# Altium footprint library MEBot.PcbLib: 161 footprints (part 5 of 11)
Each footprint in its own frame and in the unit in brackets; x right, y up, seen from the top. Pads: shape width x height; smd on the part's side, far side on the other; paste and mask are expansions set on the pad; w line width, h text height; cw(c..) or ccw(c..) is an arc to the next point about the centre after c.
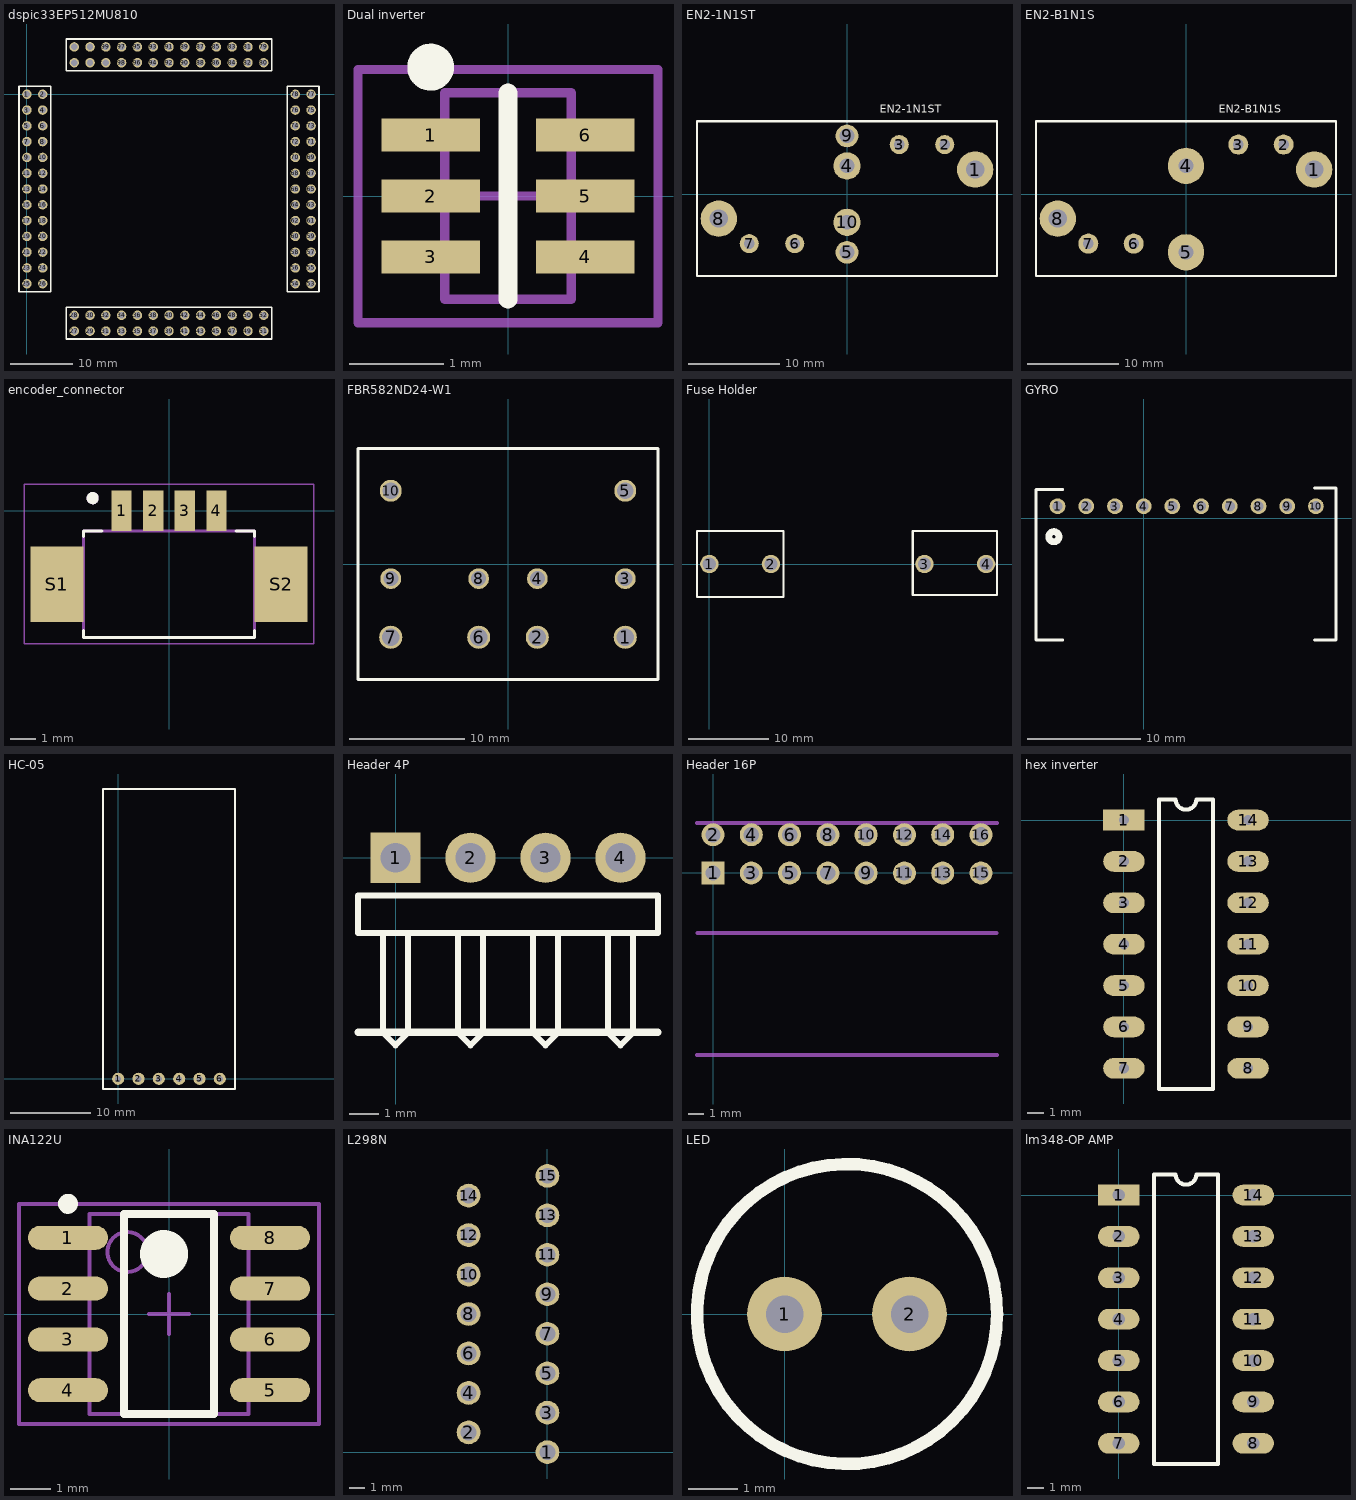
[diagram p4: the footprints below, top view; thin cyan lines are the x and y axes]

## dspic33EP512MU810 [mil] "EasyPICv7.0 MCU CARD1"
pads (104):
  round 60 hole 40: 1(0,0) 2(100,0) 3(0,-100) 4(100,-100) 5(0,-200) 6(100,-200) 7(0,-300) 8(100,-300) 9(0,-400) 10(100,-400) 11(0,-500) 12(100,-500) 13(0,-600) 14(100,-600) 15(0,-700) 16(100,-700) 17(0,-800) 18(100,-800) 19(0,-900) 20(100,-900) 21(0,-1000) 22(100,-1000) 23(0,-1100) 24(100,-1100) 25(0,-1200) 26(100,-1200) 27(300,-1500) 28(300,-1400) 29(400,-1500) 30(400,-1400) 31(500,-1500) 32(500,-1400) 33(600,-1500) 34(600,-1400) 35(700,-1500) 36(700,-1400) 37(800,-1500) 38(800,-1400) 39(900,-1500) 40(900,-1400) 41(1000,-1500) 42(1000,-1400) 43(1100,-1500) 44(1100,-1400) 45(1200,-1500) 46(1200,-1400) 47(1300,-1500) 48(1300,-1400) 49(1400,-1500) 50(1400,-1400) 51(1500,-1500) 52(1500,-1400) 53(1800,-1200) 54(1700,-1200) 55(1800,-1100) 56(1700,-1100) 57(1800,-1000) 58(1700,-1000) 59(1800,-900) 60(1700,-900) 61(1800,-800) 62(1700,-800) 63(1800,-700) 64(1700,-700) 65(1800,-600) 66(1700,-600) 67(1800,-500) 68(1700,-500) 69(1800,-400) 70(1700,-400) 71(1800,-300) 72(1700,-300) 73(1800,-200) 74(1700,-200) 75(1800,-100) 76(1700,-100) 77(1800,0) 78(1700,0) 79(1500,300) 80(1500,200) 81(1400,300) 82(1400,200) 83(1300,300) 84(1300,200) 85(1200,300) 86(1200,200) 87(1100,300) 88(1100,200) 89(1000,300) 90(1000,200) 91(900,300) 92(900,200) 93(800,300) 94(800,200) 95(700,300) 96(700,200) 97(600,300) 98(600,200) 99(500,300) 100(500,200) 101(400,300) 102(400,200) 103(300,300) 104(300,200)
Top Overlay:
  lines w10: -50,-1250 150,-1250 150,50 -50,50 -50,-1250 ; 250,-1550 1550,-1550 1550,-1350 250,-1350 250,-1550 ; 250,150 1550,150 1550,350 250,350 250,150 ; 1650,-1250 1850,-1250 1850,50 1650,50 1650,-1250
3D body "dspic.STEP": height 535, standoff 470, extent -199.99,-1699.99 2000.01,705

## Dual inverter [mm] "nc7wz14p6"
height 1.1
pads (6):
  rect 1.05x0.35 smd: 1(-0.825,0.65) 2(-0.825,0) 3(-0.825,-0.65) 4(0.825,-0.65) 5(0.825,0) 6(0.825,0.65)
Top Overlay:
  circle w0.25: c-0.825,1.375 r0.125
  lines w0.2: 0,-1.1 0,1.1 0,-1.1
Mechanical 13:
  lines w0.1: -0.675,-1.1 0.675,-1.1 0.675,1.1 -0.675,1.1 -0.675,-1.1
Mechanical 15:
  lines w0.1: -0.5,0 0.5,0 ; 0,-0.5 0,0.5 ; -1.6,-1.35 1.6,-1.35 1.6,1.35 -1.6,1.35 -1.6,-1.35
3D body: height 1.1, standoff 0.1, extent -0.675,-1.1 0.675,1.1

## EN2-1N1ST [mm] "NEC Automotive Twin Relay (Separate)"
height 15.75
pads (10):
  round 4 hole 2: 1(14.1,2.7) 8(-14.1,-2.7)
  round 2.1 hole 1.2: 2(10.75,5.45) 3(5.75,5.45) 6(-5.75,-5.45) 7(-10.75,-5.45)
  round 3 hole 1.6: 4(0,3.1) 10(0,-3.1)
  round 2.5 hole 1.6: 5(0,-6.4) 9(0,6.4)
Top Overlay:
  lines w0.25: -16.5,-9 -16.5,8 ; 16.5,-9 16.5,8
  lines w0.254: -16.5,-9 16.5,-9 ; -16.5,8 16.5,8
  text "EN2-1N1ST" at 3.6,8.6 h1.52
3D body: height 15.62, standoff 0, extent -16.627,-9.127 16.627,8.127
3D body: height 4.22, standoff 0, extent -0.797,2.311 0.797,3.908
3D body: height 4.22, standoff 0, extent -0.787,5.591 0.806,7.188
3D body: height 4.22, standoff 0, extent -0.797,-3.912 0.797,-2.315
3D body: height 4.22, standoff 0, extent -0.787,-7.185 0.806,-5.588
3D body: height 4.22, standoff 0, extent -6.338,-6.071 -5.143,-4.873
3D body: height 4.22, standoff 0, extent -11.355,-6.06 -10.16,-4.862
3D body: height 4.22, standoff 0, extent 5.131,4.837 6.326,6.034
3D body: height 4.22, standoff 0, extent 10.147,4.826 11.342,6.024
3D body: height 4.22, standoff 0, extent 13.132,1.702 15.124,3.698
3D body: height 4.22, standoff 0, extent -15.093,-3.683 -13.101,-1.687

## EN2-B1N1S [mm] "NEC Automotive Twin Relay (H-Bridge)"
pads (8):
  round 4 hole 2: 1(14.1,2.7) 8(-14.1,-2.7)
  round 2.2 hole 1.2: 2(10.75,5.45) 3(5.75,5.45) 6(-5.75,-5.45) 7(-10.75,-5.45)
  round 4 hole 1.6: 4(0,3.1) 5(0,-6.4)
Top Overlay:
  lines w0.25: -16.5,-9 -16.5,8 ; 16.5,-9 16.5,8
  lines w0.254: -16.5,-9 16.5,-9 ; -16.5,8 16.5,8
  text "EN2-B1N1S" at 3.6,8.6 h1.52

## encoder_connector [mm] "WM7622CT"
pads (6):
  rect 0.8x1.6 smd: 1(-1.875,0) 2(-0.625,0) 3(0.625,0) 4(1.875,0)
  rect 2.1x3 smd: S1(-4.425,-2.9) S2(4.425,-2.9)
Top Overlay:
  circle w0.24: c-3.015,0.5 r0.12
  lines w0.127: -3.375,-4.725 -3.375,-5 3.375,-5 3.375,-4.725 ; -3.375,-1 -3.375,-0.8 -2.65,-0.8 ; 2.65,-0.8 3.375,-0.8 3.375,-1
Mechanical 13:
  circle w0.24: c-3.015,0.5 r0.12
  lines w0.127: -3.375,-5 -3.375,-0.8 3.375,-0.8 3.375,-5 -3.375,-5
Mechanical 15:
  lines w0.05: -5.725,-5.25 5.725,-5.25 5.725,1.05 -5.725,1.05 -5.725,-5.25
3D body "0532610471--3DModel-STEP-231308.STEP": height 3.5, standoff 0.11, extent -5.075,-5.166 5.075,0.034

## FBR582ND24-W1 [mm] "Automotive Relays AUTO"
pads (10):
  round 2 hole 1.5: 1(10.16,-6.35) 2(2.54,-6.35) 6(-2.54,-6.35) 7(-10.16,-6.35)
  round 1.8 hole 1.3: 3(10.16,-1.27) 4(2.54,-1.27) 8(-2.54,-1.27) 9(-10.16,-1.27)
  round 1.9 hole 1.4: 5(10.16,6.35) 10(-10.16,6.35)
Top Overlay:
  lines w0.254: -13,-10 13,-10 13,10 -13,10 -13,-10
3D body "white_relay.STEP": height 2.23, standoff -17.47, extent -13.254,-9.873 12.746,10.127

## Fuse Holder [mil] "Thru hole"
pads (4):
  round 90 hole 65: 1(0,0) 2(300,0) 3(1047,0) 4(1347,0)
Top Overlay:
  lines w10: -60,-160 -60,160 360,160 360,-160 -60,-160 ; 990,-150 1400,-150 1400,160 990,160 990,-150
3D body "Fuse 6.3x32 and clips LF 102071.stp": height 478.79, standoff -91.73, extent -12.91,-150 1372.91,160.88

## GYRO [mil] "LPR550AL"
height 393.7
pads (10):
  round 55 hole 35: 1(-300,41.14) 2(-200,41.14) 3(-100,41.14) 4(0,41.14) 5(100,41.14) 6(200,41.14) 7(300,41.14) 8(400,41.14) 9(500,41.14) 10(600,41.14)
Top Overlay:
  circle w23.62: c-312.76,-65 r17.76
  lines w10: -282,-425 -375,-425 -375,100 -282,100 ; 595,-425 670,-425 670,105 595,105
3D body "gyroX.STEP": height 204.41, standoff -236.54, extent -356.57,-410 646.57,90

## HC-05 [mil] "Bluetooth module"
pads (6):
  round 60 hole 30: 1(0,0) 2(100,0) 3(200,0) 4(300,0) 5(400,0) 6(500,0)
Top Overlay:
  lines w10: -75,-50 575,-50 575,1425 -75,1425 -75,-50
3D body "Bluetooth Module HC-05.STEP": height 219.67, standoff 18.7, extent -64.96,-50 564.96,1406.69

## Header 4P [mm] "Connector; Header; 4 Position; Right Angle"
pads (4):
  rect 1.7x1.7 hole 1: 1(0,0)
  round 1.7 hole 1: 2(2.54,0) 3(5.08,0) 4(7.62,0)
Top Overlay:
  lines w0.2: -0.423,-2.54 -0.423,-5.927 0,-6.35 0.423,-5.927 0.423,-2.54 ; 2.117,-2.54 2.117,-5.927 2.54,-6.35 2.963,-5.927 2.963,-2.54 ; 4.657,-2.54 4.657,-5.927 5.08,-6.35 5.503,-5.927 5.503,-2.54 ; 7.197,-2.54 7.197,-5.927 7.62,-6.35 8.043,-5.927 8.043,-2.54 ; -1.27,-2.54 8.89,-2.54 8.89,-1.27 -1.27,-1.27 -1.27,-2.54
  lines w0.254: -1.27,-5.905 8.89,-5.905
3D body "022122044.stp": height 6.38, standoff -3.56, extent -1.27,-12.509 8.89,0.318

## Header 16P [mil] "16 Pin Header Tyco P/N 87320-8"
height 238
pads (16):
  rect 60x60 hole 40: 1(0,0)
  round 60 hole 40: 2(0,100) 3(100,0) 4(100,100) 5(200,0) 6(200,100) 7(300,0) 8(300,100) 9(400,0) 10(400,100) 11(500,0) 12(500,100) 13(600,0) 14(600,100) 15(700,0) 16(700,100)
Mechanical 13:
  lines w10: -42,-476 742,-476 ; -42,131 742,131 ; -41,-157 741,-157
3D body "c-87230-8-k-3d.stp": height 237, standoff -111, extent -42,-476 742,131

## hex inverter [mil] "MC14011BCP"
pads (14):
  rect 100x50 hole 25: 1(0,0)
  oval 100x50 hole 25: 2(0,-100) 3(0,-200) 4(0,-300) 5(0,-400) 6(0,-500) 7(0,-600) 8(300,-600) 9(300,-500) 10(300,-400) 11(300,-300) 12(300,-200) 13(300,-100) 14(300,0)
Top Overlay:
  lines w10: 85,-650 85,50 125,50 ccw(c150,50) 175,50 215,50 215,-650 85,-650

## INA122U [mm] "SOIC, 8-Leads, Body 5.0x4.0mm (max), Pitch 1.27mm, IPC Medium Density"
height 1.75
pads (8):
  oval 2x0.6 smd: 1(-2.525,1.905) 2(-2.525,0.635) 3(-2.525,-0.635) 4(-2.525,-1.905) 5(2.525,-1.905) 6(2.525,-0.635) 7(2.525,0.635) 8(2.525,1.905)
Top Overlay:
  circle w0.6: c-0.125,1.5 r0.3
  circle w0.25: c-2.525,2.755 r0.125
  lines w0.2: -1.125,-2.5 1.125,-2.5 1.125,2.5 -1.125,2.5 -1.125,-2.5
Mechanical 13:
  circle w0.1: c-1.04,1.55 r0.5
  lines w0.1: -1.99,-2.5 1.99,-2.5 1.99,2.5 -1.99,2.5 -1.99,-2.5
Mechanical 15:
  lines w0.1: -0.5,0 0.5,0 ; 0,-0.5 0,0.5 ; -3.75,-2.75 3.75,-2.75 3.75,2.75 -3.75,2.75 -3.75,-2.75
3D body: height 1.75, standoff 0.1, extent -1.99,-2.5 1.99,2.5

## L298N [mil]
pads (15):
  round 60 hole 40: 1(0,0) 2(-200,50) 3(0,100) 4(-200,150) 5(0,200) 6(-200,250) 7(0,300) 8(-200,350) 9(0,400) 10(-200,450) 11(0,500) 12(-200,550) 13(0,600) 14(-200,650) 15(0,700)
3D body "l298.stp": height 1037, standoff -18, extent -380.01,-47.49 16.71,747.51

## LED [mil]
pads (2):
  round 60 hole 30: 1(0,0) 2(100,0)
Top Overlay:
  circle w10: c50,0 r120
3D body "led.STEP": height 315, standoff -125, extent -70,-120 170,120

## lm348-OP AMP [mil]
pads (14):
  rect 100x50 hole 30: 1(0,0)
  oval 100x50 hole 30: 2(0,-100) 3(0,-200) 4(0,-300) 5(0,-400) 6(0,-500) 7(0,-600) 8(325,-600) 9(325,-500) 10(325,-400) 11(325,-300) 12(325,-200) 13(325,-100) 14(325,0)
Top Overlay:
  lines w10: 85,-650 85,50 137.5,50 ccw(c162.5,50) 187.5,50 240,50 240,-650 85,-650